# Altium footprint library Hydrolib_pcb.PcbLib: 97 footprints (part 5 of 7)
Each footprint in its own frame and in the unit in brackets; x right, y up, seen from the top. Pads: shape width x height; smd on the part's side, far side on the other; paste and mask are expansions set on the pad; w line width, h text height; cw(c..) or ccw(c..) is an arc to the next point about the centre after c.
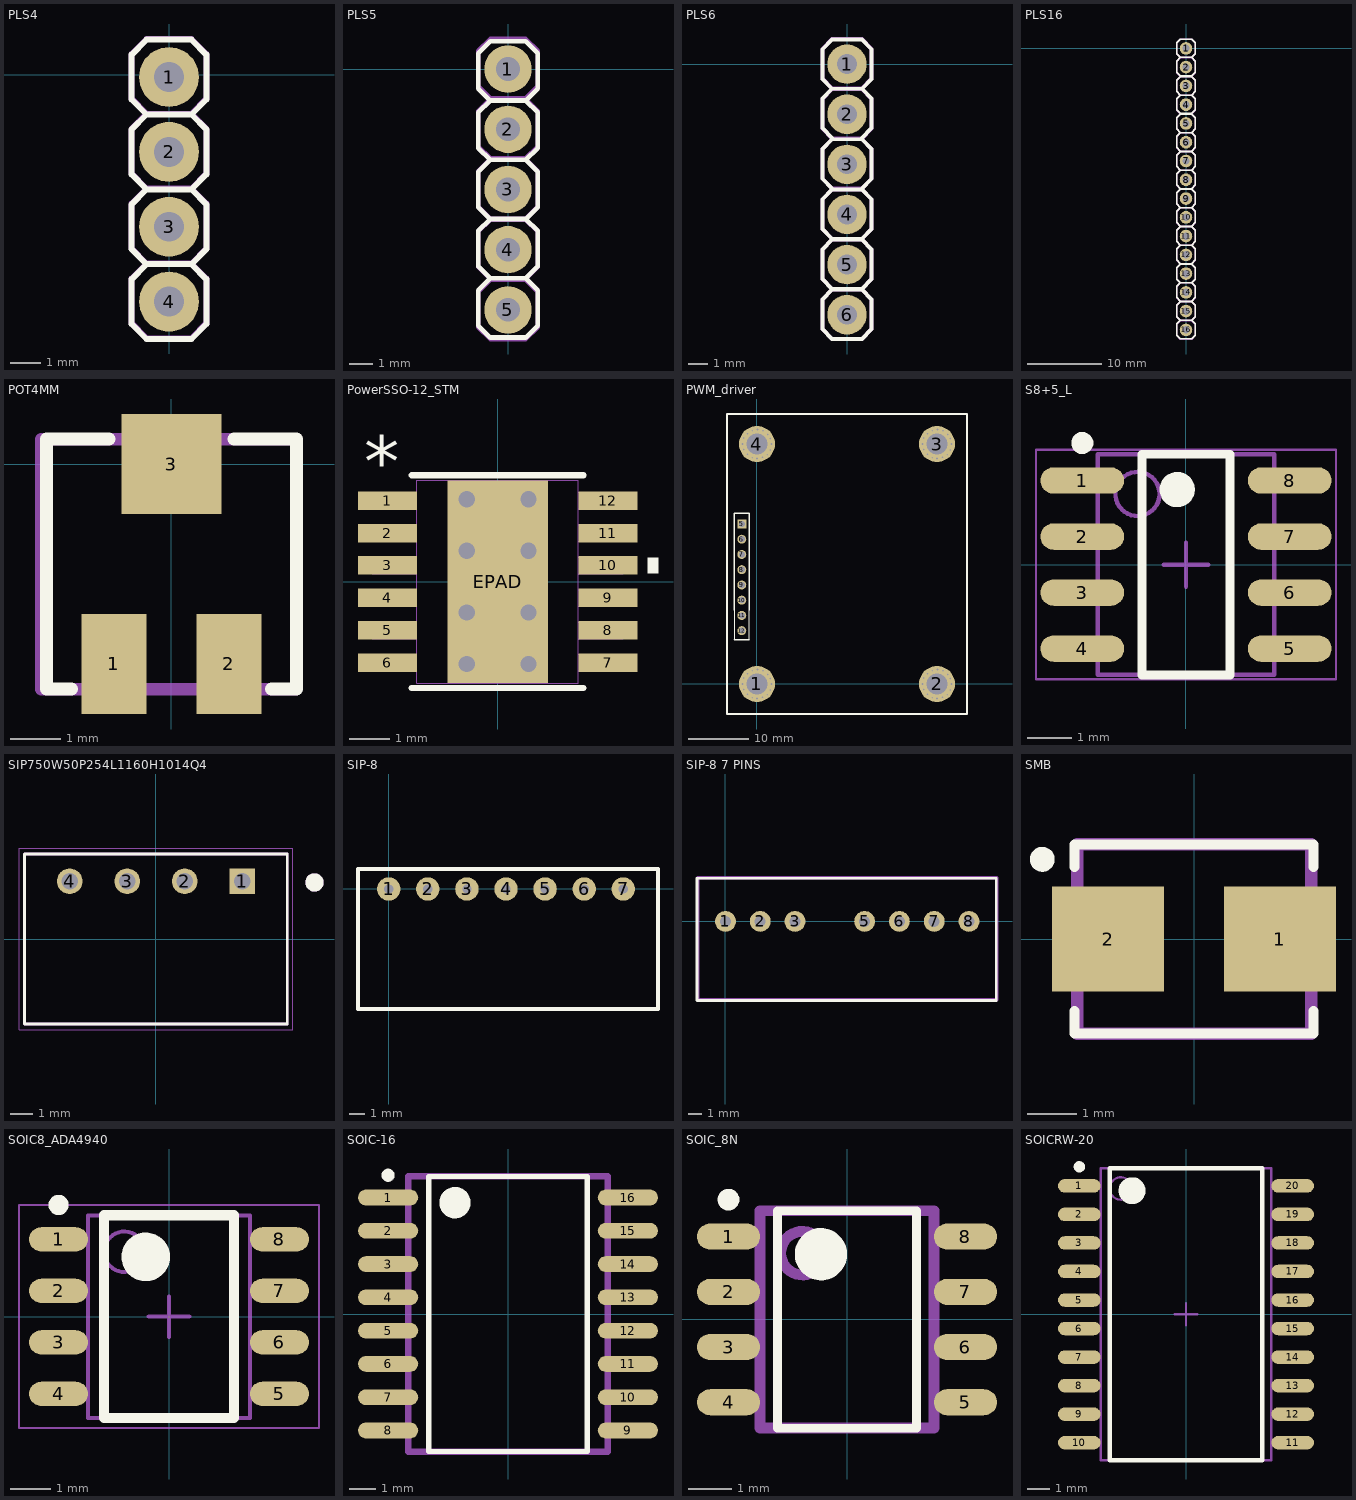
[diagram p4: the footprints below, top view; thin cyan lines are the x and y axes]

## PLS4 [mm]
pads (4):
  round 2 hole 1: 1(0,-0.08) 2(0,-2.58) 3(0,-5.08) 4(0,-7.58)
Top Overlay:
  lines w0.2: -0.75,-6.33 0.75,-6.33 ; -0.75,-6.33 -1.25,-5.83 -1.25,-4.33 -0.75,-3.83 ; -0.75,-6.33 -1.25,-6.83 -1.25,-8.33 -0.75,-8.83 0.75,-8.83 1.25,-8.33 1.25,-6.83 0.75,-6.33 ; -0.75,-3.83 -1.25,-3.33 -1.25,-1.83 -0.75,-1.33 ; -0.75,-3.83 0.75,-3.83 ; -0.75,-1.33 0.75,-1.33 ; -0.75,-1.33 -1.25,-0.83 -1.25,0.67 -0.75,1.17 0.75,1.17 1.25,0.67 1.25,-0.83 0.75,-1.33 ; 0.75,-6.33 1.25,-5.83 1.25,-4.33 0.75,-3.83 ; 0.75,-3.83 1.25,-3.33 1.25,-1.83 0.75,-1.33
Pattern top:
  lines w0.2: -0.75,-6.31 -1.25,-5.81 -1.25,-4.31 -0.75,-3.81 ; -0.75,-6.31 0.75,-6.31 ; -0.75,-6.31 0.75,-6.31 ; -0.75,-6.31 -1.25,-6.81 -1.25,-8.31 -0.75,-8.81 0.75,-8.81 1.25,-8.31 1.25,-6.81 0.75,-6.31 ; -0.75,-3.81 -1.25,-3.31 -1.25,-1.81 -0.75,-1.31 ; -0.75,-3.81 0.75,-3.81 ; -0.75,-3.81 0.75,-3.81 ; -0.75,-1.31 -1.25,-0.81 -1.25,0.69 -0.75,1.19 0.75,1.19 1.25,0.69 1.25,-0.81 0.75,-1.31 ; -0.75,-1.31 0.75,-1.31 ; -0.75,-1.31 0.75,-1.31 ; 0.75,-6.31 1.25,-5.81 1.25,-4.31 0.75,-3.81 ; 0.75,-3.81 1.25,-3.31 1.25,-1.81 0.75,-1.31
  text ".Designator" at -4.2,1.9 h2.15
3D body "User Library-PLS-1.STEP": height 8.44, standoff -3, extent -1.27,-8.93 1.27,-6.39
3D body "User Library-PLS-1.STEP": height 8.44, standoff -3, extent -1.27,-1.35 1.27,1.19
3D body "User Library-PLS-1.STEP": height 8.44, standoff -3, extent -1.27,-3.89 1.27,-1.35
3D body "User Library-PLS-1.STEP": height 8.44, standoff -3, extent -1.27,-6.43 1.27,-3.89

## PLS5 [mm]
pads (5):
  round 2 hole 1: 1(0,0) 2(0,-2.54) 3(0,-5.08) 4(0,-7.62) 5(0,-10.16)
Top Overlay:
  lines w0.2: -0.75,-8.83 0.75,-8.83 ; -0.75,-8.83 -1.25,-8.33 -1.25,-6.83 -0.75,-6.33 ; -0.75,-8.83 -1.25,-9.33 -1.25,-10.83 -0.75,-11.33 0.75,-11.33 1.25,-10.83 1.25,-9.33 0.75,-8.83 ; -0.75,-8.83 0.75,-8.83 ; -0.75,-6.33 0.75,-6.33 ; -0.75,-6.33 -1.25,-5.83 -1.25,-4.33 -0.75,-3.83 ; -0.75,-3.83 0.75,-3.83 ; -0.75,-3.83 -1.25,-3.33 -1.25,-1.83 -0.75,-1.33 ; -0.75,-1.33 0.75,-1.33 ; -0.75,-1.33 -1.25,-0.83 -1.25,0.67 -0.75,1.17 0.75,1.17 1.25,0.67 1.25,-0.83 0.75,-1.33 ; 0.75,-8.83 1.25,-8.33 1.25,-6.83 0.75,-6.33 ; 0.75,-6.33 1.25,-5.83 1.25,-4.33 0.75,-3.83 ; 0.75,-3.83 1.25,-3.33 1.25,-1.83 0.75,-1.33
Pattern top:
  lines w0.2: -1.25,-10.89 -0.75,-11.39 0.75,-11.39 1.25,-10.89 1.25,-9.39 0.75,-8.89 -0.75,-8.89 -1.25,-9.39 -1.25,-10.89 ; -1.25,-8.35 -0.75,-8.85 0.75,-8.85 1.25,-8.35 1.25,-6.85 0.75,-6.35 -0.75,-6.35 -1.25,-6.85 -1.25,-8.35 ; -1.25,-5.81 -0.75,-6.31 0.75,-6.31 1.25,-5.81 1.25,-4.31 0.75,-3.81 -0.75,-3.81 -1.25,-4.31 -1.25,-5.81 ; -1.25,-3.27 -0.75,-3.77 0.75,-3.77 1.25,-3.27 1.25,-1.77 0.75,-1.27 -0.75,-1.27 -1.25,-1.77 -1.25,-3.27 ; -1.25,-0.73 -0.75,-1.23 0.75,-1.23 1.25,-0.73 1.25,0.77 0.75,1.27 -0.75,1.27 -1.25,0.77 -1.25,-0.73
  text ".Designator" at -4.4,2 h2.15
3D body "User Library-PLS-1.STEP": height 8.44, standoff -3, extent -1.27,-1.27 1.27,1.27
3D body "User Library-PLS-1.STEP": height 8.44, standoff -3, extent -1.27,-3.81 1.27,-1.27
3D body "User Library-PLS-1.STEP": height 8.44, standoff -3, extent -1.27,-6.35 1.27,-3.81
3D body "User Library-PLS-1.STEP": height 8.44, standoff -3, extent -1.27,-8.89 1.27,-6.35
3D body "User Library-PLS-1.STEP": height 8.44, standoff -3, extent -1.27,-11.43 1.27,-8.89

## PLS6 [mm]
pads (6):
  round 2 hole 1: 1(0,0) 2(0,-2.54) 3(0,-5.08) 4(0,-7.62) 5(0,-10.16) 6(0,-12.7)
Top Overlay:
  lines w0.2: -0.75,-6.31 -1.25,-5.81 -1.25,-4.31 -0.75,-3.81 0.75,-3.81 1.25,-4.31 1.25,-5.81 0.75,-6.31 ; -0.75,-3.75 -1.25,-3.25 -1.25,-1.75 -0.75,-1.25 ; 0.75,-3.75 1.25,-3.25 1.25,-1.75 0.75,-1.25 ; -0.75,-1.25 0.75,-1.25 ; -0.75,-1.25 -1.25,-0.75 -1.25,0.75 -0.75,1.25 0.75,1.25 1.25,0.75 1.25,-0.75 0.75,-1.25 ; -1.25,-13.43 -0.75,-13.93 0.75,-13.93 1.25,-13.43 1.25,-11.93 0.75,-11.43 -0.75,-11.43 -1.25,-11.93 -1.25,-13.43 ; -1.25,-10.89 -1.25,-9.39 -0.75,-8.89 0.75,-8.89 1.25,-9.39 1.25,-10.89 0.75,-11.39 -0.75,-11.39 -1.25,-10.89 ; -1.25,-8.35 -0.75,-8.85 0.75,-8.85 1.25,-8.35 1.25,-6.85 0.75,-6.35 -0.75,-6.35 -1.25,-6.85 -1.25,-8.35
Pattern top:
  lines w0.2: -1.25,-13.43 -1.25,-11.93 -0.75,-11.43 0.75,-11.43 1.25,-11.93 1.25,-13.43 0.75,-13.93 -0.75,-13.93 -1.25,-13.43 ; -1.25,-10.89 -1.25,-9.39 -0.75,-8.89 0.75,-8.89 1.25,-9.39 1.25,-10.89 0.75,-11.39 -0.75,-11.39 -1.25,-10.89 ; -1.25,-8.35 -1.25,-6.85 -0.75,-6.35 0.75,-6.35 1.25,-6.85 1.25,-8.35 0.75,-8.85 -0.75,-8.85 -1.25,-8.35 ; -1.25,-5.81 -1.25,-4.31 -0.75,-3.81 0.75,-3.81 1.25,-4.31 1.25,-5.81 0.75,-6.31 -0.75,-6.31 -1.25,-5.81 ; -1.25,-3.27 -1.25,-1.77 -0.75,-1.27 0.75,-1.27 1.25,-1.77 1.25,-3.27 0.75,-3.77 -0.75,-3.77 -1.25,-3.27 ; -1.25,-0.73 -1.25,0.77 -0.75,1.27 0.75,1.27 1.25,0.77 1.25,-0.73 0.75,-1.23 -0.75,-1.23 -1.25,-0.73
  text ".Designator" at -4.3,2 h2.15
3D body "User Library-PLS-1.STEP": height 8.44, standoff -3, extent -1.27,-13.97 1.27,-11.43
3D body "User Library-PLS-1.STEP": height 8.44, standoff -3, extent -1.27,-11.43 1.27,-8.89
3D body "User Library-PLS-1.STEP": height 8.44, standoff -3, extent -1.27,-8.89 1.27,-6.35
3D body "User Library-PLS-1.STEP": height 8.44, standoff -3, extent -1.27,-6.35 1.27,-3.81
3D body "User Library-PLS-1.STEP": height 8.44, standoff -3, extent -1.27,-3.81 1.27,-1.27
3D body "User Library-PLS-1.STEP": height 8.44, standoff -3, extent -1.27,-1.27 1.27,1.27

## PLS16 [mm]
pads (16):
  round 1.7 hole 1 paste+0: 1(0,0) 2(0,-2.54) 3(0,-5.08) 4(0,-7.62) 5(0,-10.16) 6(0,-12.7) 7(0,-15.24) 8(0,-17.78) 9(0,-20.32) 10(0,-22.86) 11(0,-25.4) 12(0,-27.94) 13(0,-30.48) 14(0,-33.02) 15(0,-35.56) 16(0,-38.1)
Top Overlay:
  lines w0.2: -0.75,-36.79 0.75,-36.79 ; -0.75,-36.79 -1.25,-37.29 -1.25,-38.79 -0.75,-39.29 0.75,-39.29 1.25,-38.79 1.25,-37.29 0.75,-36.79 ; -0.75,-36.79 -1.25,-36.29 -1.25,-34.79 -0.75,-34.29 0.75,-34.29 1.25,-34.79 1.25,-36.29 0.75,-36.79 ; -0.75,-31.71 0.75,-31.71 ; -0.75,-31.71 -1.25,-32.21 -1.25,-33.71 -0.75,-34.21 0.75,-34.21 1.25,-33.71 1.25,-32.21 0.75,-31.71 ; -0.75,-31.71 -1.25,-31.21 -1.25,-29.71 -0.75,-29.21 0.75,-29.21 1.25,-29.71 1.25,-31.21 0.75,-31.71 ; -0.75,-26.63 0.75,-26.63 ; -0.75,-26.63 -1.25,-27.13 -1.25,-28.63 -0.75,-29.13 0.75,-29.13 1.25,-28.63 1.25,-27.13 0.75,-26.63 ; -0.75,-26.63 -1.25,-26.13 -1.25,-24.63 -0.75,-24.13 0.75,-24.13 1.25,-24.63 1.25,-26.13 0.75,-26.63 ; -0.75,-21.55 0.75,-21.55 ; -0.75,-21.55 -1.25,-22.05 -1.25,-23.55 -0.75,-24.05 0.75,-24.05 1.25,-23.55 1.25,-22.05 0.75,-21.55 ; -0.75,-21.55 -1.25,-21.05 -1.25,-19.55 -0.75,-19.05 0.75,-19.05 1.25,-19.55 1.25,-21.05 0.75,-21.55 ; -0.75,-16.47 0.75,-16.47 ; -0.75,-16.47 -1.25,-16.97 -1.25,-18.47 -0.75,-18.97 0.75,-18.97 1.25,-18.47 1.25,-16.97 0.75,-16.47 ; -0.75,-16.47 -1.25,-15.97 -1.25,-14.47 -0.75,-13.97 0.75,-13.97 1.25,-14.47 1.25,-15.97 0.75,-16.47 ; -0.75,-11.39 0.75,-11.39 ; -0.75,-11.39 -1.25,-11.89 -1.25,-13.39 -0.75,-13.89 0.75,-13.89 1.25,-13.39 1.25,-11.89 0.75,-11.39 ; -0.75,-11.39 -1.25,-10.89 -1.25,-9.39 -0.75,-8.89 0.75,-8.89 1.25,-9.39 1.25,-10.89 0.75,-11.39 ; -0.75,-6.31 0.75,-6.31 ; -0.75,-6.31 -1.25,-6.81 -1.25,-8.31 -0.75,-8.81 0.75,-8.81 1.25,-8.31 1.25,-6.81 0.75,-6.31 ; -0.75,-6.31 -1.25,-5.81 -1.25,-4.31 -0.75,-3.81 0.75,-3.81 1.25,-4.31 1.25,-5.81 0.75,-6.31 ; -0.75,-1.23 0.75,-1.23 ; -0.75,-1.23 -1.25,-1.73 -1.25,-3.23 -0.75,-3.73 0.75,-3.73 1.25,-3.23 1.25,-1.73 0.75,-1.23 ; -0.75,-1.23 -1.25,-0.73 -1.25,0.77 -0.75,1.27 0.75,1.27 1.25,0.77 1.25,-0.73 0.75,-1.23
Pattern top:
  lines w0.2: -1.25,-10.89 -1.25,-9.39 ; -1.25,-10.89 -0.75,-11.39 ; -1.25,-10.89 -1.25,-9.39 ; -1.25,-10.89 -0.75,-11.39 ; -1.25,-9.39 -0.75,-8.89 ; -1.25,-9.39 -0.75,-8.89 ; -0.75,-11.39 0.75,-11.39 ; -0.75,-11.39 0.75,-11.39 ; -0.75,-8.89 0.75,-8.89 ; -0.75,-8.89 0.75,-8.89 ; 0.75,-11.39 1.25,-10.89 ; 0.75,-11.39 1.25,-10.89 ; 0.75,-8.89 1.25,-9.39 ; 0.75,-8.89 1.25,-9.39 ; 1.25,-10.89 1.25,-9.39 ; 1.25,-10.89 1.25,-9.39 ; -1.25,-38.83 -1.25,-37.33 -0.75,-36.83 0.75,-36.83 1.25,-37.33 1.25,-38.83 0.75,-39.33 -0.75,-39.33 -1.25,-38.83 ; -1.25,-36.29 -1.25,-34.79 -0.75,-34.29 0.75,-34.29 1.25,-34.79 1.25,-36.29 0.75,-36.79 -0.75,-36.79 -1.25,-36.29 ; -1.25,-33.75 -1.25,-32.25 -0.75,-31.75 0.75,-31.75 1.25,-32.25 1.25,-33.75 0.75,-34.25 -0.75,-34.25 -1.25,-33.75 ; -1.25,-31.21 -1.25,-29.71 -0.75,-29.21 0.75,-29.21 1.25,-29.71 1.25,-31.21 0.75,-31.71 -0.75,-31.71 -1.25,-31.21 ; -1.25,-28.67 -1.25,-27.17 -0.75,-26.67 0.75,-26.67 1.25,-27.17 1.25,-28.67 0.75,-29.17 -0.75,-29.17 -1.25,-28.67 ; -1.25,-26.13 -1.25,-24.63 -0.75,-24.13 0.75,-24.13 1.25,-24.63 1.25,-26.13 0.75,-26.63 -0.75,-26.63 -1.25,-26.13 ; -1.25,-23.59 -1.25,-22.09 -0.75,-21.59 0.75,-21.59 1.25,-22.09 1.25,-23.59 0.75,-24.09 -0.75,-24.09 -1.25,-23.59 ; -1.25,-21.05 -1.25,-19.55 -0.75,-19.05 0.75,-19.05 1.25,-19.55 1.25,-21.05 0.75,-21.55 -0.75,-21.55 -1.25,-21.05 ; -1.25,-18.51 -1.25,-17.01 -0.75,-16.51 0.75,-16.51 1.25,-17.01 1.25,-18.51 0.75,-19.01 -0.75,-19.01 -1.25,-18.51 ; -1.25,-15.97 -1.25,-14.47 -0.75,-13.97 0.75,-13.97 1.25,-14.47 1.25,-15.97 0.75,-16.47 -0.75,-16.47 -1.25,-15.97 ; -1.25,-13.43 -1.25,-11.93 -0.75,-11.43 0.75,-11.43 1.25,-11.93 1.25,-13.43 0.75,-13.93 -0.75,-13.93 -1.25,-13.43 ; -1.25,-8.35 -1.25,-6.85 -0.75,-6.35 0.75,-6.35 1.25,-6.85 1.25,-8.35 0.75,-8.85 -0.75,-8.85 -1.25,-8.35 ; -1.25,-5.81 -1.25,-4.31 -0.75,-3.81 0.75,-3.81 1.25,-4.31 1.25,-5.81 0.75,-6.31 -0.75,-6.31 -1.25,-5.81 ; -1.25,-3.27 -1.25,-1.77 -0.75,-1.27 0.75,-1.27 1.25,-1.77 1.25,-3.27 0.75,-3.77 -0.75,-3.77 -1.25,-3.27 ; -1.25,-0.73 -1.25,0.77 -0.75,1.27 0.75,1.27 1.25,0.77 1.25,-0.73 0.75,-1.23 -0.75,-1.23 -1.25,-0.73
  text ".Designator" at -3.9,2.2 h2.15
3D body "User Library-PLS-1.STEP": height 8.44, standoff -3, extent -1.27,-39.37 1.27,-36.83
3D body "User Library-PLS-1.STEP": height 8.44, standoff -3, extent -1.27,-36.83 1.27,-34.29
3D body "User Library-PLS-1.STEP": height 8.44, standoff -3, extent -1.27,-34.29 1.27,-31.75
3D body "User Library-PLS-1.STEP": height 8.44, standoff -3, extent -1.27,-31.75 1.27,-29.21
3D body "User Library-PLS-1.STEP": height 8.44, standoff -3, extent -1.27,-29.21 1.27,-26.67
3D body "User Library-PLS-1.STEP": height 8.44, standoff -3, extent -1.27,-26.67 1.27,-24.13
3D body "User Library-PLS-1.STEP": height 8.44, standoff -3, extent -1.27,-24.13 1.27,-21.59
3D body "User Library-PLS-1.STEP": height 8.44, standoff -3, extent -1.27,-21.59 1.27,-19.05
3D body "User Library-PLS-1.STEP": height 8.44, standoff -3, extent -1.27,-19.05 1.27,-16.51
3D body "User Library-PLS-1.STEP": height 8.44, standoff -3, extent -1.27,-16.51 1.27,-13.97
3D body "User Library-PLS-1.STEP": height 8.44, standoff -3, extent -1.27,-13.97 1.27,-11.43
3D body "User Library-PLS-1.STEP": height 8.44, standoff -3, extent -1.27,-11.43 1.27,-8.89
3D body "User Library-PLS-1.STEP": height 8.44, standoff -3, extent -1.27,-8.89 1.27,-6.35
3D body "User Library-PLS-1.STEP": height 8.44, standoff -3, extent -1.27,-6.35 1.27,-3.81
3D body "User Library-PLS-1.STEP": height 8.44, standoff -3, extent -1.27,-3.81 1.27,-1.27
3D body "User Library-PLS-1.STEP": height 8.44, standoff -3, extent -1.27,-1.27 1.27,1.27

## POT4MM [mm]
pads (3):
  rect 1.3x2 smd: 1(-1.15,-4) 2(1.15,-4)
  rect 2x2 smd: 3(0,0)
Top Overlay:
  lines w0.254: -2,-4.5 -2.5,-4.5 -2.5,0.5 -1.25,0.5 ; 1.25,0.5 2.5,0.5 2.5,-4.5 2,-4.5
Pattern top:
  lines w0.25: -2.6,-4.5 -2.6,0.5 2.5,0.5 2.5,-4.5 -2.6,-4.5
  text ".Designator" at -2.6,1.4 h2.15
3D body "3303X003.stp": height 1.31, standoff -0.04, extent -1.5,-3.873 1.497,-0.127

## PowerSSO-12_STM [mm]
pads (13):
  rect 1.455x0.456 smd paste+0 mask+0: 1(-2.721,2) 2(-2.721,1.2) 3(-2.721,0.4) 4(-2.721,-0.4) 5(-2.721,-1.2) 6(-2.721,-2) 7(2.721,-2) 8(2.721,-1.2) 9(2.721,-0.4) 10(2.721,0.4) 11(2.721,1.2) 12(2.721,2)
  rect 2.489x5 smd paste-2.083 mask+0: EPAD(0,0)
via -0.762,-2.032 diameter 0.7 hole 0.4
via -0.762,-0.762 diameter 0.7 hole 0.4
via 0.762,-2.032 diameter 0.7 hole 0.4
via 0.762,-0.762 diameter 0.7 hole 0.4
via 0.762,0.762 diameter 0.7 hole 0.4
via -0.762,0.762 diameter 0.7 hole 0.4
via 0.762,2.032 diameter 0.7 hole 0.4
via -0.762,2.032 diameter 0.7 hole 0.4
Top Overlay:
  region: 3.703,0.59 3.957,0.59 3.957,0.209 3.703,0.209
  lines w0.152: -2.121,-2.629 2.121,-2.629 ; -2.121,2.629 2.121,2.629
  text "*" at -3.293,2.329 h1.27
Top Paste:
  region: 1.145,-0.798 -1.145,-0.798 -1.145,-1.996 1.145,-1.996
  region: 1.145,0.599 -1.145,0.599 -1.145,-0.599 1.145,-0.599
  region: 1.145,1.996 -1.145,1.996 -1.145,0.798 1.145,0.798
Mechanical 13:
  lines w0: -0.305,2.502 ccw(c0,2.502) 0.305,2.502
  lines w0.025: -3.099,-2.203 -1.994,-2.203 -1.994,-1.797 -3.099,-1.797 -3.099,-2.203 ; -3.099,-1.403 -1.994,-1.403 -1.994,-0.997 -3.099,-0.997 -3.099,-1.403 ; -3.099,-0.603 -1.994,-0.603 -1.994,-0.197 -3.099,-0.197 -3.099,-0.603 ; -3.099,0.197 -1.994,0.197 -1.994,0.603 -3.099,0.603 -3.099,0.197 ; -3.099,0.997 -1.994,0.997 -1.994,1.403 -3.099,1.403 -3.099,0.997 ; -3.099,1.797 -1.994,1.797 -1.994,2.203 -3.099,2.203 -3.099,1.797 ; -1.994,-2.502 -1.994,2.502 1.994,2.502 1.994,-2.502 -1.994,-2.502 ; 1.994,-2.203 3.099,-2.203 3.099,-1.797 1.994,-1.797 1.994,-2.203 ; 1.994,-1.403 3.099,-1.403 3.099,-0.997 1.994,-0.997 1.994,-1.403 ; 1.994,-0.603 3.099,-0.603 3.099,-0.197 1.994,-0.197 1.994,-0.603 ; 1.994,0.197 3.099,0.197 3.099,0.603 1.994,0.603 1.994,0.197 ; 1.994,0.997 3.099,0.997 3.099,1.403 1.994,1.403 1.994,0.997 ; 1.994,1.797 3.099,1.797 3.099,2.203 1.994,2.203 1.994,1.797
  text "*" at -1.93,1.156 h1.27
3D body "PowerSSO-12_STM.step": height 1.63, standoff 0, extent -3.099,-2.502 3.099,2.502

## PWM_driver [mm]
pads (12):
  round 6 hole 3.5: 1(0,0) 2(30,0) 3(30,40) 4(0,40)
  rect 1.5x1.5 hole 1: 5(-2.54,26.67)
  round 1.5 hole 1: 6(-2.54,24.13) 7(-2.54,21.59) 8(-2.54,19.05) 9(-2.54,16.51) 10(-2.54,13.97) 11(-2.54,11.43) 12(-2.54,8.89)
via 0.1,2.4 diameter 0.7 hole 0.3
via 2.4,0 diameter 0.7 hole 0.3
via 0,-2.4 diameter 0.7 hole 0.3
via -2.4,0 diameter 0.7 hole 0.3
via -2.2,1 diameter 0.7 hole 0.3
via -1.6,1.7 diameter 0.7 hole 0.3
via -0.8,2.2 diameter 0.7 hole 0.3
via 1,2.2 diameter 0.7 hole 0.3
via 1.8,1.6 diameter 0.7 hole 0.3
via 2.2,0.9 diameter 0.7 hole 0.3
via -2.2,-0.9 diameter 0.7 hole 0.3
via -1.6,-1.7 diameter 0.7 hole 0.3
via -0.8,-2.3 diameter 0.7 hole 0.3
via 0.9,-2.2 diameter 0.7 hole 0.3
via 1.7,-1.8 diameter 0.7 hole 0.3
via 2.2,-1 diameter 0.7 hole 0.3
via 32.2,-1 diameter 0.7 hole 0.3
via 31.7,-1.8 diameter 0.7 hole 0.3
via 30.9,-2.2 diameter 0.7 hole 0.3
via 29.2,-2.3 diameter 0.7 hole 0.3
via 28.4,-1.7 diameter 0.7 hole 0.3
via 27.8,-0.9 diameter 0.7 hole 0.3
via 32.2,0.9 diameter 0.7 hole 0.3
via 31.8,1.6 diameter 0.7 hole 0.3
via 31,2.2 diameter 0.7 hole 0.3
via 29.2,2.2 diameter 0.7 hole 0.3
via 28.4,1.7 diameter 0.7 hole 0.3
via 27.8,1 diameter 0.7 hole 0.3
via 27.6,0 diameter 0.7 hole 0.3
via 30,-2.4 diameter 0.7 hole 0.3
via 32.4,0 diameter 0.7 hole 0.3
via 30.1,2.4 diameter 0.7 hole 0.3
via 2.2,39 diameter 0.7 hole 0.3
via 1.7,38.2 diameter 0.7 hole 0.3
via 0.9,37.8 diameter 0.7 hole 0.3
via -0.8,37.7 diameter 0.7 hole 0.3
via -1.6,38.3 diameter 0.7 hole 0.3
via -2.2,39.1 diameter 0.7 hole 0.3
via 2.2,40.9 diameter 0.7 hole 0.3
via 1.8,41.6 diameter 0.7 hole 0.3
via 1,42.2 diameter 0.7 hole 0.3
via -0.8,42.2 diameter 0.7 hole 0.3
via -1.6,41.7 diameter 0.7 hole 0.3
via -2.2,41 diameter 0.7 hole 0.3
via -2.4,40 diameter 0.7 hole 0.3
via 0,37.6 diameter 0.7 hole 0.3
via 2.4,40 diameter 0.7 hole 0.3
via 0.1,42.4 diameter 0.7 hole 0.3
via 32.2,39 diameter 0.7 hole 0.3
via 31.7,38.2 diameter 0.7 hole 0.3
via 30.9,37.8 diameter 0.7 hole 0.3
via 29.2,37.7 diameter 0.7 hole 0.3
via 28.4,38.3 diameter 0.7 hole 0.3
via 27.8,39.1 diameter 0.7 hole 0.3
via 32.2,40.9 diameter 0.7 hole 0.3
via 31.8,41.6 diameter 0.7 hole 0.3
via 31,42.2 diameter 0.7 hole 0.3
via 29.2,42.2 diameter 0.7 hole 0.3
via 28.4,41.7 diameter 0.7 hole 0.3
via 27.8,41 diameter 0.7 hole 0.3
via 27.6,40 diameter 0.7 hole 0.3
via 30,37.6 diameter 0.7 hole 0.3
via 32.4,40 diameter 0.7 hole 0.3
via 30.1,42.4 diameter 0.7 hole 0.3
Top Overlay:
  lines w0.2: -3.81,7.366 -3.81,28.448 -1.27,28.448 -1.27,7.366
  lines w0.254: -3.81,7.366 -1.27,7.366 ; -3.81,12.27 -3.81,28.45 -1.27,28.45 -1.27,12.27
  lines w0.3: -5,-5 -5,45 35,45 35,-5 -5,-5

## S8+5_L [mm] "SOIC, 8-Leads, Body 4.9x3.9mm, Pitch 1.27mm, IPC High Density"
height 1.75
pads (8):
  oval 1.9x0.6 smd: 1(-2.35,1.905) 2(-2.35,0.635) 3(-2.35,-0.635) 4(-2.35,-1.905) 5(2.35,-1.905) 6(2.35,-0.635) 7(2.35,0.635) 8(2.35,1.905)
Top Overlay:
  circle w0.4: c-0.2,1.7 r0.2
  circle w0.25: c-2.35,2.755 r0.125
  lines w0.2: -1,-2.5 1,-2.5 1,2.5 -1,2.5 -1,-2.5
Mechanical 13:
  circle w0.1: c-1.1,1.6 r0.5
  lines w0.1: -2,-2.5 2,-2.5 2,2.5 -2,2.5 -2,-2.5
Mechanical 15:
  lines w0.05: -3.4,-2.6 3.4,-2.6 3.4,2.6 -3.4,2.6 -3.4,-2.6
  lines w0.1: -0.5,0 0.5,0 ; 0,-0.5 0,0.5
3D body: height 1.75, standoff 0.1, extent -2,-2.5 2,2.5

## SIP750W50P254L1160H1014Q4 [mm]
pads (4):
  rect 1.13x1.13 hole 0.73: 1(3.81,2.55)
  round 1.13 hole 0.73: 2(1.27,2.55) 3(-1.27,2.55) 4(-3.81,2.55)
Top Overlay:
  circle w0.4: c7,2.5 r0.2
  lines w0.127: -5.8,-3.75 5.8,-3.75 5.8,3.75 -5.8,3.75 -5.8,-3.75
Mechanical 13:
  circle w0.4: c7,2.5 r0.2
  lines w0.127: -5.8,-3.75 5.8,-3.75 5.8,3.75 -5.8,3.75 -5.8,-3.75
Mechanical 15:
  lines w0.05: -6.05,-4 6.05,-4 6.05,4 -6.05,4 -6.05,-4
3D body "sip4.STEP": height 10.14, standoff -3.81, extent -5.837,-3.835 5.763,3.665

## SIP-8 [mil]
pads (7):
  round 60 hole 23.62: 1(0,0) 2(100,0) 3(200,0) 4(300,0) 5(400,0) 6(500,0) 7(600,0)
Top Overlay:
  lines w9.84: -78.74,51.18 688.98,51.18 688.98,-307.09 ; 688.98,-307.09 688.98,-307.09
  lines w10: -78.74,51.18 -78.74,-307.09 688.98,-307.09

## SIP-8 7 PINS [mil]
pads (7):
  round 60 hole 31.5: 1(0,0) 2(100,0) 3(200,0) 5(400,0) 6(500,0) 7(600,0) 8(700,0)
Top Overlay:
  lines w7.87: -81.69,-227.17 778.54,-227.17 778.54,124.02 -81.69,124.02 -81.69,-227.17
Pattern top:
  lines w9.84: -79.72,-225.2 -79.72,125.98 780.51,125.98 780.51,-225.2 -79.72,-225.2
3D body "AM2G-Z.step": height 439.76, standoff -120.08, extent -106.3,-236.22 753.94,125.98

## SMB [mm] "Diod"
height 2.4
pads (2):
  rect 2.25x2.1 smd: 1(1.725,0) 2(-1.725,0)
Top Overlay:
  circle w0.25: c-3.05,1.6 r0.125
  lines w0.2: -2.4,-1.45 -2.4,-1.9 2.4,-1.9 2.4,-1.45 ; -2.4,1.45 -2.4,1.9 2.4,1.9 2.4,1.45
Pattern top:
  lines w0.25: -2.35,-1.9 2.35,-1.9 2.35,1.9 -2.35,1.9 -2.35,-1.9
  text ".Designator" at -3.3,2.2 h2.15
3D body "SMB.step": height 2.4, standoff 0, extent -2.57,-1.9 2.57,1.9

## SOIC8_ADA4940 [mm] "8-Lead Standard Small Outline Package [SOIC_N] Narrow Body"
height 1.75
pads (8):
  oval 1.45x0.6 smd: 1(-2.725,1.905) 2(-2.725,0.635) 3(-2.725,-0.635) 4(-2.725,-1.905) 5(2.725,-1.905) 6(2.725,-0.635) 7(2.725,0.635) 8(2.725,1.905)
Top Overlay:
  circle w0.25: c-2.725,2.755 r0.125
  circle w0.6: c-0.575,1.475 r0.3
  lines w0.25: -1.6,-2.5 -1.6,2.5 1.6,2.5 1.6,-2.5 -1.6,-2.5
Mechanical 13:
  circle w0.1: c-1.1,1.6 r0.5
  lines w0.1: -2,-2.5 -2,2.5 2,2.5 2,-2.5 -2,-2.5
Mechanical 15:
  lines w0.05: -3.7,-2.75 -3.7,2.75 3.7,2.75 3.7,-2.75 -3.7,-2.75
  lines w0.1: -0.5,0 0.5,0 ; 0,-0.5 0,0.5
3D body "SOIC8_ADA4940.step": height 1.75, standoff 0, extent -3,-2.5 3,2.5

## SOIC-16 [mm] "SOIC, 16-Leads, Body 10,30x7,50mm, Pitch 1,27mm, IPC Medium Density"
height 2.65
pads (16):
  oval 2.3x0.6 smd: 1(-4.575,4.445) 2(-4.575,3.175) 3(-4.575,1.905) 4(-4.575,0.635) 5(-4.575,-0.635) 6(-4.575,-1.905) 7(-4.575,-3.175) 8(-4.575,-4.445) 9(4.575,-4.445) 10(4.575,-3.175) 11(4.575,-1.905) 12(4.575,-0.635) 13(4.575,0.635) 14(4.575,1.905) 15(4.575,3.175) 16(4.575,4.445)
Top Overlay:
  circle w0.6: c-2.025,4.25 r0.3
  circle w0.25: c-4.575,5.295 r0.125
  lines w0.2: -3.025,-5.25 3.025,-5.25 3.025,5.25 -3.025,5.25 -3.025,-5.25
Pattern top:
  lines w0.25: -3.8,-5.25 3.8,-5.25 3.8,5.25 -3.8,5.25 -3.8,-5.25
  text ".Designator" at 0,10.203 h2.15
3D body: height 2.65, standoff 0.2, extent -3.8,-5.25 3.8,5.25

## SOIC_8N [mm] "for operational amplifier"
height 1.75
pads (8):
  oval 1.45x0.6 smd: 1(-2.725,1.905) 2(-2.725,0.635) 3(-2.725,-0.635) 4(-2.725,-1.905) 5(2.725,-1.905) 6(2.725,-0.635) 7(2.725,0.635) 8(2.725,1.905)
Top Overlay:
  circle w0.6: c-0.6,1.5 r0.3
  circle w0.25: c-2.725,2.755 r0.125
  lines w0.2: -1.6,-2.5 1.6,-2.5 1.6,2.5 -1.6,2.5 -1.6,-2.5
Pattern top:
  circle w0.25: c-1.025,1.525 r0.5
  lines w0.25: -2,-2.5 2,-2.5 2,2.5 -2,2.5 -2,-2.5
3D body "SOIC_8N.step": height 1.75, standoff 0, extent -3,-2.5 3,2.5

## SOICRW-20 [mm] "20-Lead Standart Small Outline Package [SOIC_W] Wide Body (RW-20)"
height 2.65
pads (20):
  oval 1.9x0.6 smd: 1(-4.75,5.715) 2(-4.75,4.445) 3(-4.75,3.175) 4(-4.75,1.905) 5(-4.75,0.635) 6(-4.75,-0.635) 7(-4.75,-1.905) 8(-4.75,-3.175) 9(-4.75,-4.445) 10(-4.75,-5.715) 11(4.75,-5.715) 12(4.75,-4.445) 13(4.75,-3.175) 14(4.75,-1.905) 15(4.75,-0.635) 16(4.75,0.635) 17(4.75,1.905) 18(4.75,3.175) 19(4.75,4.445) 20(4.75,5.715)
Top Overlay:
  circle w0.25: c-4.75,6.565 r0.125
  circle w0.6: c-2.4,5.5 r0.3
  lines w0.2: -3.4,-6.5 -3.4,6.5 3.4,6.5 3.4,-6.5 -3.4,-6.5
Pattern top:
  circle w0.1: c-2.9,5.6 r0.5
  lines w0.1: -3.8,-6.5 -3.8,6.5 3.8,6.5 3.8,-6.5 -3.8,-6.5
Mechanical 15:
  lines w0.1: -0.5,0 0.5,0 ; 0,-0.5 0,0.5
3D body "SOICRW-20.step": height 2.65, standoff 0, extent -5.162,-6.5 5.162,6.5